# Altium footprint library PCBLIB.PcbLib: 775 footprints (part 2 of 49)
Each footprint in its own frame and in the unit in brackets; x right, y up, seen from the top. Pads: shape width x height; smd on the part's side, far side on the other; paste and mask are expansions set on the pad; w line width, h text height; cw(c..) or ccw(c..) is an arc to the next point about the centre after c.
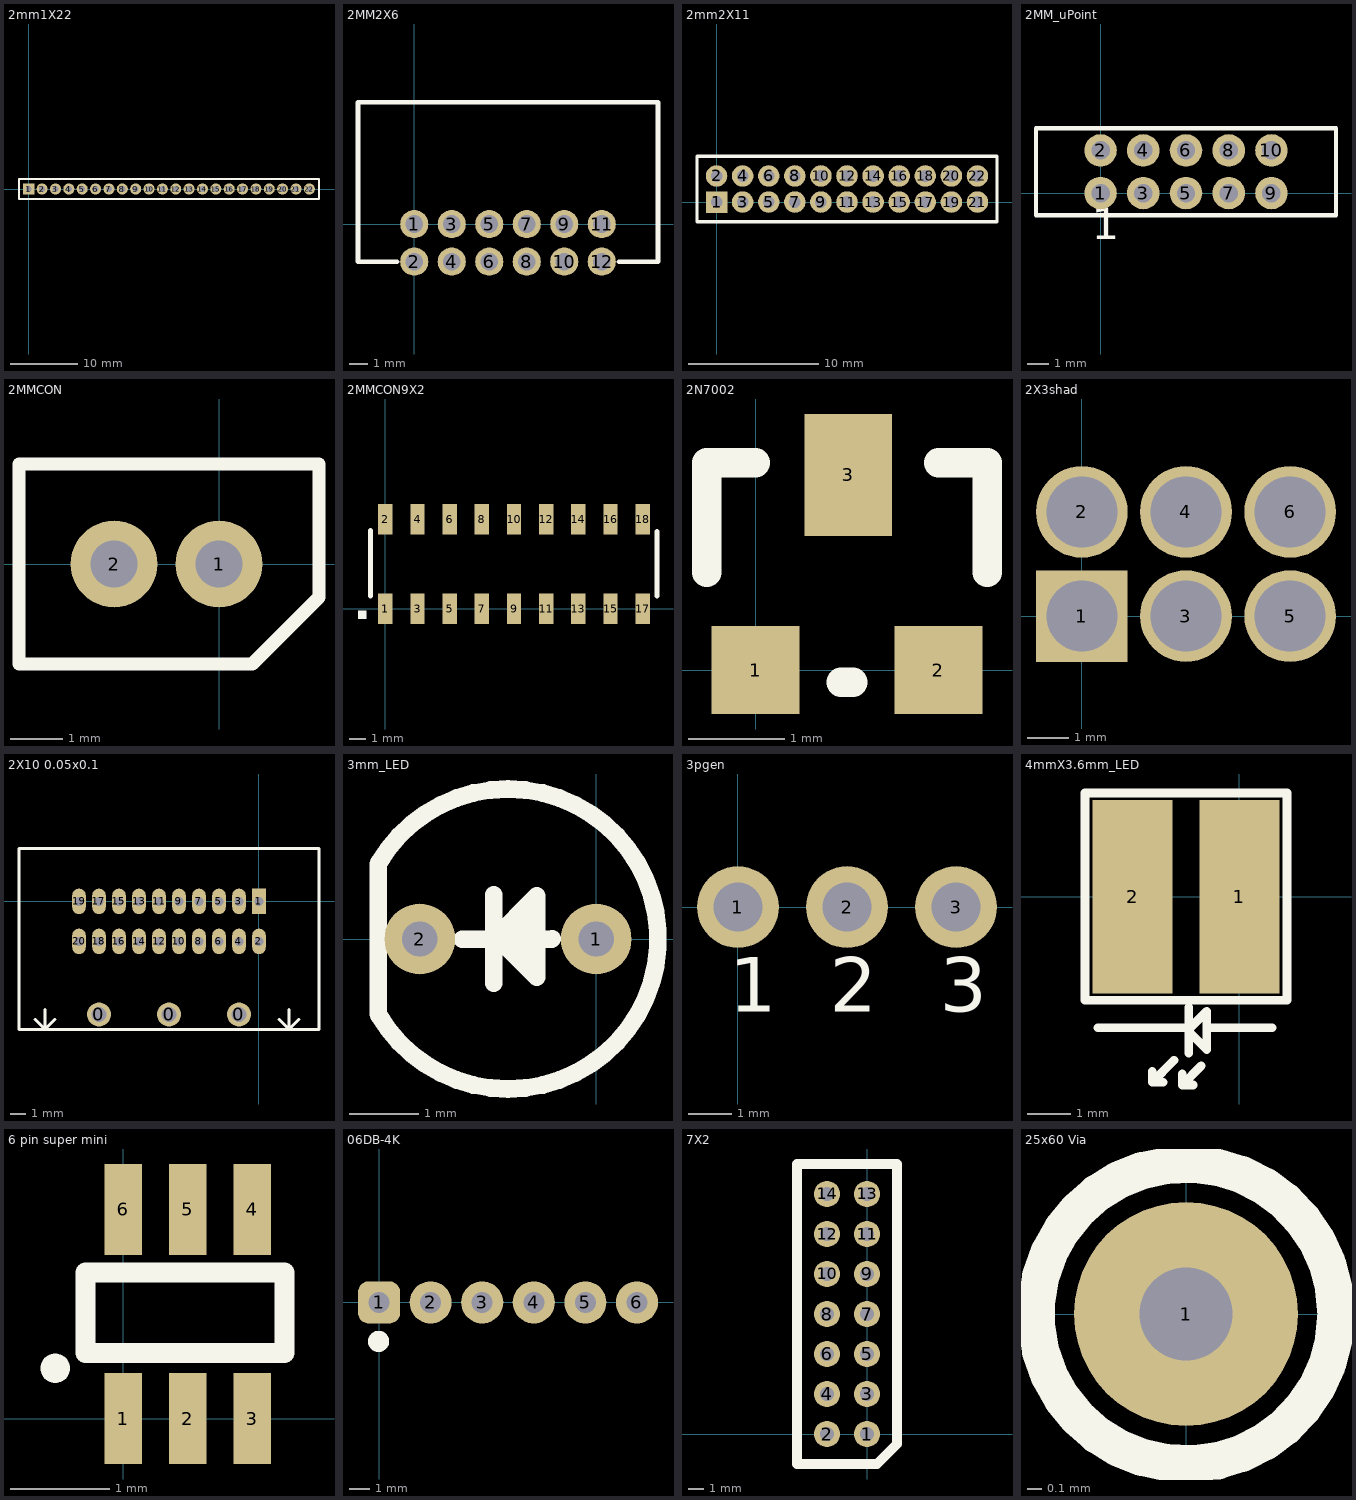
[diagram p1: the footprints below, top view; thin cyan lines are the x and y axes]

## 2mm1X22 [mil]
pads (22):
  rect 65x65 hole 35 unplated: 1(0,0)
  round 65 hole 35 unplated: 2(78.74,0) 3(157.48,0) 4(236.22,0) 5(314.96,0) 6(393.7,0) 7(472.44,0) 8(551.18,0) 9(629.92,0) 10(708.66,0) 11(787.4,0) 12(866.14,0) 13(944.88,0) 14(1023.62,0) 15(1102.36,0) 16(1181.1,0) 17(1259.84,0) 18(1338.58,0) 19(1417.32,0) 20(1496.06,0) 21(1574.8,0) 22(1653.54,0)
TopOverlay:
  lines w10: -57.52,-59 -57.52,59 1710.54,59 1710.54,-59 -57.52,-59

## 2MM2X6 [mm]
height 6.35
pads (12):
  round 1.5 hole 0.95: 1(0,0) 2(0,-2) 3(2,0) 4(2,-2) 5(4,0) 6(4,-2) 7(6,0) 8(6,-2) 9(8,0) 10(8,-2) 11(10,0) 12(10,-2)
TopOverlay:
  lines w0.254: -0.914,-2 -3,-2 -3,6.5 13,6.5 13,-2 10.922,-2

## 2mm2X11 [mil]
pads (22):
  rect 65x65 hole 35 unplated: 1(0,0)
  round 65 hole 35 unplated: 2(0,78.74) 3(78.74,0) 4(78.74,78.74) 5(157.48,0) 6(157.48,78.74) 7(236.22,0) 8(236.22,78.74) 9(314.96,0) 10(314.96,78.74) 11(393.7,0) 12(393.7,78.74) 13(472.44,0) 14(472.44,78.74) 15(551.18,0) 16(551.18,78.74) 17(629.92,0) 18(629.92,78.74) 19(708.66,0) 20(708.66,78.74) 21(787.4,0) 22(787.4,78.74)
TopOverlay:
  lines w10: -59.06,-59.06 846.46,-59.06 846.46,137.8 -59.06,137.8 -59.06,-59.06

## 2MM_uPoint [mil]
height 205
pads (10):
  round 60 hole 34: 1(0,0) 2(0,78.74) 3(78.74,0) 4(78.74,78.74) 5(157.48,0) 6(157.48,78.74) 7(236.22,0) 8(236.22,78.74) 9(314.96,0) 10(314.96,78.74)
TopOverlay:
  lines w8: -119.02,-40.63 -119.02,119.37 433.98,119.37 433.98,-40.63 -119.02,-40.63
  text "1" at -16.44,-104.22 h100

## 2MMCON [mil]
pads (2):
  round 65 hole 35: 1(0,0) 2(-78.74,0)
TopOverlay:
  lines w10: -150,-75 -150,75 75,75 75,-25 25,-75 0,-75 -150,-75
  text "." at 75,-70 h60
Mechanical4:
  text ".400" at 0,0 h1

## 2MMCON9X2 [mil]
height 142
pads (18):
  rect 35x75 smd: 1(0,0) 2(0,218.47) 3(78.74,0) 4(78.74,218.47) 5(157.48,0) 6(157.48,218.47) 7(236.22,0) 8(236.22,218.47) 9(314.96,0) 10(314.96,218.47) 11(393.7,0) 12(393.7,218.47) 13(472.44,0) 14(472.44,218.47) 15(551.18,0) 16(551.18,218.47) 17(629.92,0) 18(629.92,218.47)
TopOverlay:
  rectangle: -67,-25 -46,-4
  lines w12: -36,31 -36,191 ; 665,31 665,189

## 2N7002 [mil]
height 0.04
pads (3):
  rect 36x36 smd: 1(0,0) 2(75,0)
  rect 36x50 smd: 3(38,80)
TopOverlay:
  lines w12: -20,40 -20,85 0,85 ; 35,-5 40,-5 ; 75,85 95,85 95,40
Mechanical4:
  text ".040" at 0,0 h1

## 2X3shad [mil]
pads (6):
  rect 88x88 hole 68: 1(0,0)
  round 88 hole 68: 2(0,100) 3(100,0) 4(100,100) 5(200,0) 6(200,100)
Mechanical4:
  text ".400" at 0,0 h1
  text ".341" at -0.27,0 h1

## 2X10 0.05x0.1 [mil]
pads (23):
  round 60 hole 37: 0(-400,-282.5) 0(-225,-282.5) 0(-50,-282.5)
  rect 34x64 hole 22: 1(0,0)
  oval 34x64 hole 22: 2(0,-100) 3(-50,0) 4(-50,-100) 5(-100,0) 6(-100,-100) 7(-150,0) 8(-150,-100) 9(-200,0) 10(-200,-100) 11(-250,0) 12(-250,-100) 13(-300,0) 14(-300,-100) 15(-350,0) 16(-350,-100) 17(-400,0) 18(-400,-100) 19(-450,0) 20(-450,-100)
TopOverlay:
  lines w8: -560,-295 -535,-320 -510,-295 ; -535,-318 -535,-270 ; 50,-295 75,-320 100,-295 ; 75,-318 75,-270 ; -600,-320 -600,132 150,132 150,-320 -600,-320

## 3mm_LED [mil]
pads (2):
  round 40 hole 20: 1(0,0) 2(-100,0)
TopOverlay:
  lines w10: -75.88,-0.12 -55.26,-0.12 ; -62.22,-0.12 -25.11,-0.12 -24.86,0.14 ; -58.1,-25 -58.1,25 ; -47.79,1.43 -35.68,13.54 -33.62,13.54 ; -46.5,-6.82 -36.45,3.23 -33.62,3.23 ; -40.32,-9.91 -37.48,-7.08 -33.62,-7.08 ; -55.26,-0.12 -33.62,-21.76 -33.62,24.36 -58.1,-0.12 -55.26,-0.12 ; -123.61,-42.5 ccw(c-50,0) -123.61,42.5 -123.61,-42.5
Mechanical4:
  text ".720" at -100,0 h1
  text ".910" at -100.21,-0.01 h1
  text ".250" at -100,0 h1

## 3pgen [mil]
pads (3):
  round 75 hole 45: 1(0,0) 2(100,0) 3(200,0)
TopOverlay:
  text "1" at -8,-96 h50
  text "2" at 84,-96 h50
  text "3" at 185,-96 h50
Mechanical4:
  text ".100" at 0,0 h1

## 4mmX3.6mm_LED [mil]
height 157.48
pads (2):
  rect 73.1x177 smd: 1(0,0) 2(-98,0)
TopOverlay:
  lines w8: -130,-120 -50,-120 ; -80,-160 -80,-170 ; -70,-170 -80,-170 ; -60,-150 -80,-170 ; -52.5,-162.5 -52.5,-172.5 ; -46.49,-143.51 -46.49,-123.51 ; -46.49,-101.49 -46.49,-121.49 ; -42.5,-172.5 -52.5,-172.5 ; -35,-155 -52.5,-172.5 ; -30,-135 -30,-120 ; -30,-130 -30,-140 -46.49,-123.51 ; 30,-120 0,-120 -30,-120 ; -46.49,-123.51 -46.49,-121.49 ; -46.49,-121.49 -30,-105 -30,-120 ; -141.51,-95 43.5,-95 43.5,95 -141.5,95 -141.5,-95

## 6 pin super mini [mil]
pads (7):
  rect 15x36 smd: 1(0,0) 2(25.59,0) 3(51.18,0) 4(51.18,83) 5(25.59,83) 6(0,83)
  round 11.81 on Top Overlay: ""(-27,20)
TopOverlay:
  lines w8: 64,57 64,26 -15,26 -15,58 64,58

## 06DB-4K [mil]
height 280
pads (6):
  rrect50% 80x80 hole 40: 1(0,0)
  round 80 hole 40: 2(98,0) 3(196,0) 4(294,0) 5(392,0) 6(490,0)
TopOverlay:
  circle w20: c-1,-74 r10

## 7X2 [mil]
height 390
pads (14):
  round 65 hole 35: 1(0,0) 2(-100,0) 3(0,100) 4(-100,100) 5(0,200) 6(-100,200) 7(0,300) 8(-100,300) 9(0,400) 10(-100,400) 11(0,500) 12(-100,500) 13(0,600) 14(-100,600)
TopOverlay:
  lines w24: -175,-75 -175,675 75,675 75,-25 25,-75 0,-75 -175,-75
  text "." at 75,-75 h60
Mechanical4:
  text ".465" at 0,0 h1

## 25x60 Via [mil]
pads (1):
  round 60 hole 25: 1(0,0)
TopOverlay:
  circle w10: c0,0 r40.16